# Altium footprint library Indruino.PcbLib: 383 footprints (part 17 of 24)
Each footprint in its own frame and in the unit in brackets; x right, y up, seen from the top. Pads: shape width x height; smd on the part's side, far side on the other; paste and mask are expansions set on the pad; w line width, h text height; cw(c..) or ccw(c..) is an arc to the next point about the centre after c.
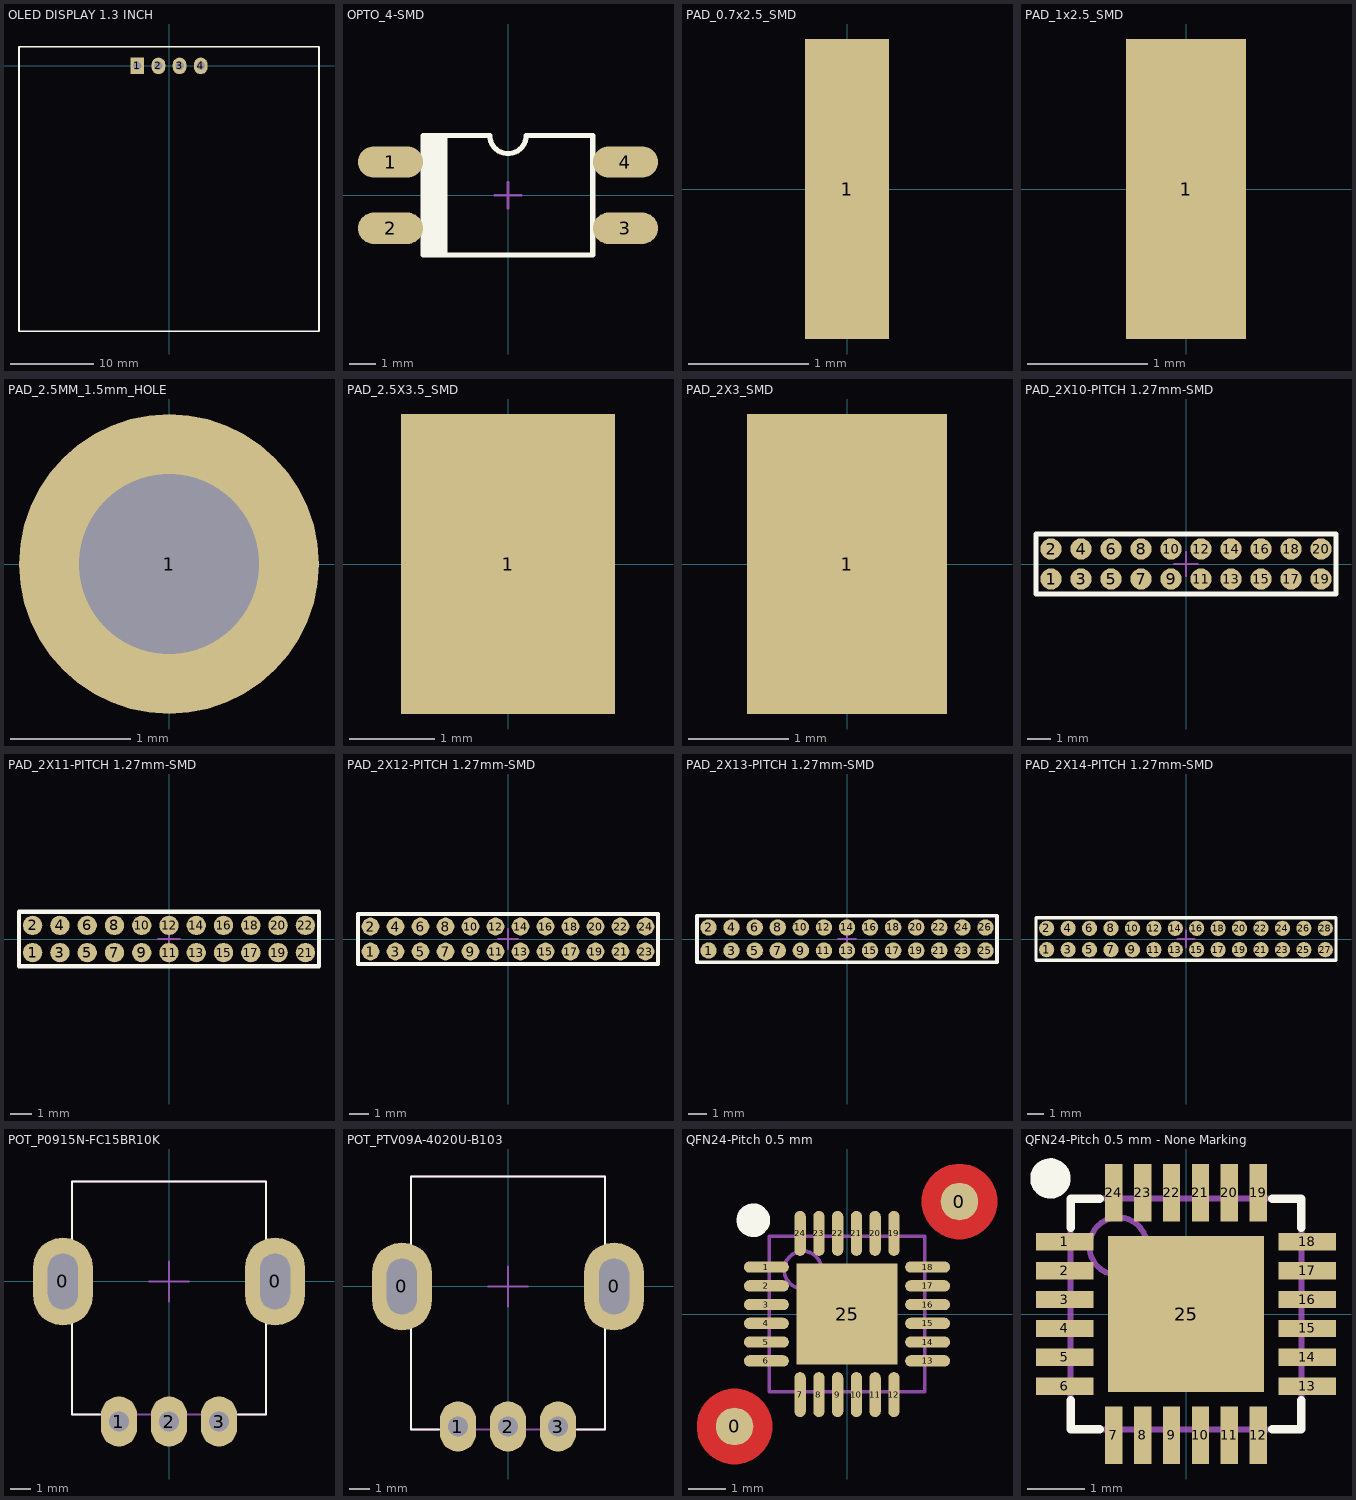
[diagram p16: the footprints below, top view; thin cyan lines are the x and y axes]

## OLED DISPLAY 1.3 INCH [mm]
pads (4):
  rect 1.65x2 hole 1: 1(-3.81,0)
  oval 1.65x2 hole 1: 2(-1.27,0) 3(1.27,0) 4(3.81,0)
Top Overlay:
  lines w0.2: -18,-31.85 18,-31.85 18,2.3 -18,2.3 -18,-31.85
3D body "OLED MONITOR V1.0.STEP": height 9, standoff -2.94, extent -17.7,-31.5 17.7,2

## OPTO_4-SMD [mm]
pads (4):
  oval 2.5x1.2 smd: 1(-4.5,1.27) 2(-4.5,-1.27) 3(4.5,-1.27) 4(4.5,1.27)
Top Overlay:
  rectangle: -3.25,-2.29 -2.32,2.32
  lines w0.2: -3.25,-2.29 -3.25,2.29 -0.7,2.29 ccw(c0,2.29) 0.7,2.29 3.25,2.29 3.25,-2.29 -3.25,-2.29
Mechanical 15:
  lines w0.1: -0.5,0 0.5,0 ; 0,-0.5 0,0.5
3D body "PC817.STEP": height 3.91, standoff 0, extent -5,-2.278 5,2.302

## PAD_0.7x2.5_SMD [mm]
height 2
pads (1):
  rect 0.7x2.5 smd: 1(0,0)
3D body: height 0.05, standoff 0, extent -0.35,-1.25 0.35,1.25

## PAD_1x2.5_SMD [mm]
height 2
pads (1):
  rect 1x2.5 smd: 1(0,0)
3D body: height 0.05, standoff 0, extent -0.5,-1.25 0.5,1.25

## PAD_2.5MM_1.5mm_HOLE [mm]
pads (1):
  round 2.5 hole 1.5: 1(0,0)

## PAD_2.5X3.5_SMD [mm]
height 2
pads (1):
  rect 2.5x3.5 smd: 1(0,0)
3D body: height 0.05, standoff 0, extent -1.25,-1.75 1.25,1.75

## PAD_2X3_SMD [mm]
height 2
pads (1):
  rect 2x3 smd: 1(0,0)
3D body: height 0.05, standoff 0, extent -1,-1.5 1,1.5

## PAD_2X10-PITCH 1.27mm-SMD [mm]
pads (20):
  round 0.9 smd: 1(-5.715,-0.635) 2(-5.715,0.635) 3(-4.445,-0.635) 4(-4.445,0.635) 5(-3.175,-0.635) 6(-3.175,0.635) 7(-1.905,-0.635) 8(-1.905,0.635) 9(-0.635,-0.635) 10(-0.635,0.635) 11(0.635,-0.635) 12(0.635,0.635) 13(1.905,-0.635) 14(1.905,0.635) 15(3.175,-0.635) 16(3.175,0.635) 17(4.445,-0.635) 18(4.445,0.635) 19(5.715,-0.635) 20(5.715,0.635)
Top Overlay:
  lines w0.2: -6.35,-1.27 6.35,-1.27 6.35,1.27 -6.35,1.27 -6.35,-1.27
Mechanical 15:
  lines w0.1: -0.5,0 0.5,0 ; 0,-0.5 0,0.5
3D body: height 0.1, standoff 0, extent 3.995,0.185 4.895,1.085
3D body: height 0.1, standoff 0, extent 3.995,-1.085 4.895,-0.185
3D body: height 0.1, standoff 0, extent 5.265,-1.085 6.165,-0.185
3D body: height 0.1, standoff 0, extent 5.265,0.185 6.165,1.085
3D body: height 0.1, standoff 0, extent 1.455,0.185 2.355,1.085
3D body: height 0.1, standoff 0, extent 1.455,-1.085 2.355,-0.185
3D body: height 0.1, standoff 0, extent 2.725,-1.085 3.625,-0.185
3D body: height 0.1, standoff 0, extent 2.725,0.185 3.625,1.085
3D body: height 0.1, standoff 0, extent -1.085,0.185 -0.185,1.085
3D body: height 0.1, standoff 0, extent -1.085,-1.085 -0.185,-0.185
3D body: height 0.1, standoff 0, extent 0.185,-1.085 1.085,-0.185
3D body: height 0.1, standoff 0, extent 0.185,0.185 1.085,1.085
3D body: height 0.1, standoff 0, extent -3.625,0.185 -2.725,1.085
3D body: height 0.1, standoff 0, extent -3.625,-1.085 -2.725,-0.185
3D body: height 0.1, standoff 0, extent -2.355,-1.085 -1.455,-0.185
3D body: height 0.1, standoff 0, extent -2.355,0.185 -1.455,1.085
3D body: height 0.1, standoff 0, extent -6.165,0.185 -5.265,1.085
3D body: height 0.1, standoff 0, extent -6.165,-1.085 -5.265,-0.185
3D body: height 0.1, standoff 0, extent -4.895,-1.085 -3.995,-0.185
3D body: height 0.1, standoff 0, extent -4.895,0.185 -3.995,1.085

## PAD_2X11-PITCH 1.27mm-SMD [mm]
pads (22):
  round 0.9 smd: 1(-6.35,-0.635) 2(-6.35,0.635) 3(-5.08,-0.635) 4(-5.08,0.635) 5(-3.81,-0.635) 6(-3.81,0.635) 7(-2.54,-0.635) 8(-2.54,0.635) 9(-1.27,-0.635) 10(-1.27,0.635) 11(0,-0.635) 12(0,0.635) 13(1.27,-0.635) 14(1.27,0.635) 15(2.54,-0.635) 16(2.54,0.635) 17(3.81,-0.635) 18(3.81,0.635) 19(5.08,-0.635) 20(5.08,0.635) 21(6.35,-0.635) 22(6.35,0.635)
Top Overlay:
  lines w0.2: -6.985,-1.27 -6.985,1.27 6.985,1.27 6.985,-1.27 -6.985,-1.27
Mechanical 15:
  lines w0.1: -0.5,0 0.5,0 ; 0,-0.5 0,0.5
3D body: height 0.1, standoff 0, extent -5.53,0.185 -4.63,1.085
3D body: height 0.1, standoff 0, extent -5.53,-1.085 -4.63,-0.185
3D body: height 0.1, standoff 0, extent -6.8,-1.085 -5.9,-0.185
3D body: height 0.1, standoff 0, extent -6.8,0.185 -5.9,1.085
3D body: height 0.1, standoff 0, extent -2.99,0.185 -2.09,1.085
3D body: height 0.1, standoff 0, extent -2.99,-1.085 -2.09,-0.185
3D body: height 0.1, standoff 0, extent -4.26,-1.085 -3.36,-0.185
3D body: height 0.1, standoff 0, extent -4.26,0.185 -3.36,1.085
3D body: height 0.1, standoff 0, extent -0.45,0.185 0.45,1.085
3D body: height 0.1, standoff 0, extent -0.45,-1.085 0.45,-0.185
3D body: height 0.1, standoff 0, extent -1.72,-1.085 -0.82,-0.185
3D body: height 0.1, standoff 0, extent -1.72,0.185 -0.82,1.085
3D body: height 0.1, standoff 0, extent 2.09,0.185 2.99,1.085
3D body: height 0.1, standoff 0, extent 2.09,-1.085 2.99,-0.185
3D body: height 0.1, standoff 0, extent 0.82,-1.085 1.72,-0.185
3D body: height 0.1, standoff 0, extent 0.82,0.185 1.72,1.085
3D body: height 0.1, standoff 0, extent 4.63,0.185 5.53,1.085
3D body: height 0.1, standoff 0, extent 4.63,-1.085 5.53,-0.185
3D body: height 0.1, standoff 0, extent 3.36,-1.085 4.26,-0.185
3D body: height 0.1, standoff 0, extent 3.36,0.185 4.26,1.085
3D body: height 0.1, standoff 0, extent 5.9,-1.085 6.8,-0.185
3D body: height 0.1, standoff 0, extent 5.9,0.185 6.8,1.085

## PAD_2X12-PITCH 1.27mm-SMD [mm]
pads (24):
  round 0.9 smd: 1(-6.985,-0.635) 2(-6.985,0.635) 3(-5.715,-0.635) 4(-5.715,0.635) 5(-4.445,-0.635) 6(-4.445,0.635) 7(-3.175,-0.635) 8(-3.175,0.635) 9(-1.905,-0.635) 10(-1.905,0.635) 11(-0.635,-0.635) 12(-0.635,0.635) 13(0.635,-0.635) 14(0.635,0.635) 15(1.905,-0.635) 16(1.905,0.635) 17(3.175,-0.635) 18(3.175,0.635) 19(4.445,-0.635) 20(4.445,0.635) 21(5.715,-0.635) 22(5.715,0.635) 23(6.985,-0.635) 24(6.985,0.635)
Top Overlay:
  lines w0.2: -7.62,-1.27 -7.62,1.27 7.62,1.27 7.62,-1.27 -7.62,-1.27
Mechanical 15:
  lines w0.1: -0.5,0 0.5,0 ; 0,-0.5 0,0.5
3D body: height 0.1, standoff 0, extent -7.435,0.185 -6.535,1.085
3D body: height 0.1, standoff 0, extent -7.435,-1.085 -6.535,-0.185
3D body: height 0.1, standoff 0, extent -6.165,-1.085 -5.265,-0.185
3D body: height 0.1, standoff 0, extent -6.165,0.185 -5.265,1.085
3D body: height 0.1, standoff 0, extent -3.625,0.185 -2.725,1.085
3D body: height 0.1, standoff 0, extent -3.625,-1.085 -2.725,-0.185
3D body: height 0.1, standoff 0, extent -4.895,-1.085 -3.995,-0.185
3D body: height 0.1, standoff 0, extent -4.895,0.185 -3.995,1.085
3D body: height 0.1, standoff 0, extent -1.085,0.185 -0.185,1.085
3D body: height 0.1, standoff 0, extent -1.085,-1.085 -0.185,-0.185
3D body: height 0.1, standoff 0, extent -2.355,-1.085 -1.455,-0.185
3D body: height 0.1, standoff 0, extent -2.355,0.185 -1.455,1.085
3D body: height 0.1, standoff 0, extent 1.455,0.185 2.355,1.085
3D body: height 0.1, standoff 0, extent 1.455,-1.085 2.355,-0.185
3D body: height 0.1, standoff 0, extent 0.185,-1.085 1.085,-0.185
3D body: height 0.1, standoff 0, extent 0.185,0.185 1.085,1.085
3D body: height 0.1, standoff 0, extent 3.995,0.185 4.895,1.085
3D body: height 0.1, standoff 0, extent 3.995,-1.085 4.895,-0.185
3D body: height 0.1, standoff 0, extent 2.725,-1.085 3.625,-0.185
3D body: height 0.1, standoff 0, extent 2.725,0.185 3.625,1.085
3D body: height 0.1, standoff 0, extent 6.535,0.185 7.435,1.085
3D body: height 0.1, standoff 0, extent 6.535,-1.085 7.435,-0.185
3D body: height 0.1, standoff 0, extent 5.265,-1.085 6.165,-0.185
3D body: height 0.1, standoff 0, extent 5.265,0.185 6.165,1.085

## PAD_2X13-PITCH 1.27mm-SMD [mm]
pads (26):
  round 0.9 smd: 1(-7.62,-0.635) 2(-7.62,0.635) 3(-6.35,-0.635) 4(-6.35,0.635) 5(-5.08,-0.635) 6(-5.08,0.635) 7(-3.81,-0.635) 8(-3.81,0.635) 9(-2.54,-0.635) 10(-2.54,0.635) 11(-1.27,-0.635) 12(-1.27,0.635) 13(0,-0.635) 14(0,0.635) 15(1.27,-0.635) 16(1.27,0.635) 17(2.54,-0.635) 18(2.54,0.635) 19(3.81,-0.635) 20(3.81,0.635) 21(5.08,-0.635) 22(5.08,0.635) 23(6.35,-0.635) 24(6.35,0.635) 25(7.62,-0.635) 26(7.62,0.635)
Top Overlay:
  lines w0.2: -8.255,-1.27 8.255,-1.27 8.255,1.27 -8.255,1.27 -8.255,-1.27
Mechanical 15:
  lines w0.1: -0.5,0 0.5,0 ; 0,-0.5 0,0.5
3D body: height 0.1, standoff 0, extent 4.63,0.185 5.53,1.085
3D body: height 0.1, standoff 0, extent 4.63,-1.085 5.53,-0.185
3D body: height 0.1, standoff 0, extent 5.9,-1.085 6.8,-0.185
3D body: height 0.1, standoff 0, extent 5.9,0.185 6.8,1.085
3D body: height 0.1, standoff 0, extent 2.09,0.185 2.99,1.085
3D body: height 0.1, standoff 0, extent 2.09,-1.085 2.99,-0.185
3D body: height 0.1, standoff 0, extent 3.36,-1.085 4.26,-0.185
3D body: height 0.1, standoff 0, extent 3.36,0.185 4.26,1.085
3D body: height 0.1, standoff 0, extent -0.45,0.185 0.45,1.085
3D body: height 0.1, standoff 0, extent -0.45,-1.085 0.45,-0.185
3D body: height 0.1, standoff 0, extent 0.82,-1.085 1.72,-0.185
3D body: height 0.1, standoff 0, extent 0.82,0.185 1.72,1.085
3D body: height 0.1, standoff 0, extent -2.99,0.185 -2.09,1.085
3D body: height 0.1, standoff 0, extent -2.99,-1.085 -2.09,-0.185
3D body: height 0.1, standoff 0, extent -1.72,-1.085 -0.82,-0.185
3D body: height 0.1, standoff 0, extent -1.72,0.185 -0.82,1.085
3D body: height 0.1, standoff 0, extent -5.53,0.185 -4.63,1.085
3D body: height 0.1, standoff 0, extent -5.53,-1.085 -4.63,-0.185
3D body: height 0.1, standoff 0, extent -4.26,-1.085 -3.36,-0.185
3D body: height 0.1, standoff 0, extent -4.26,0.185 -3.36,1.085
3D body: height 0.1, standoff 0, extent -6.8,0.185 -5.9,1.085
3D body: height 0.1, standoff 0, extent -6.8,-1.085 -5.9,-0.185
3D body: height 0.1, standoff 0, extent -8.07,-1.085 -7.17,-0.185
3D body: height 0.1, standoff 0, extent -8.07,0.185 -7.17,1.085
3D body: height 0.1, standoff 0, extent 7.17,0.185 8.07,1.085
3D body: height 0.1, standoff 0, extent 7.17,-1.085 8.07,-0.185

## PAD_2X14-PITCH 1.27mm-SMD [mm]
pads (28):
  round 0.9 smd: 1(-8.255,-0.635) 2(-8.255,0.635) 3(-6.985,-0.635) 4(-6.985,0.635) 5(-5.715,-0.635) 6(-5.715,0.635) 7(-4.445,-0.635) 8(-4.445,0.635) 9(-3.175,-0.635) 10(-3.175,0.635) 11(-1.905,-0.635) 12(-1.905,0.635) 13(-0.635,-0.635) 14(-0.635,0.635) 15(0.635,-0.635) 16(0.635,0.635) 17(1.905,-0.635) 18(1.905,0.635) 19(3.175,-0.635) 20(3.175,0.635) 21(4.445,-0.635) 22(4.445,0.635) 23(5.715,-0.635) 24(5.715,0.635) 25(6.985,-0.635) 26(6.985,0.635) 27(8.255,-0.635) 28(8.255,0.635)
Top Overlay:
  lines w0.2: -8.89,-1.27 8.89,-1.27 8.89,1.27 -8.89,1.27 -8.89,-1.27
Mechanical 15:
  lines w0.1: -0.5,0 0.5,0 ; 0,-0.5 0,0.5
3D body: height 0.1, standoff 0, extent 3.995,0.185 4.895,1.085
3D body: height 0.1, standoff 0, extent 3.995,-1.085 4.895,-0.185
3D body: height 0.1, standoff 0, extent 5.265,-1.085 6.165,-0.185
3D body: height 0.1, standoff 0, extent 5.265,0.185 6.165,1.085
3D body: height 0.1, standoff 0, extent 1.455,0.185 2.355,1.085
3D body: height 0.1, standoff 0, extent 1.455,-1.085 2.355,-0.185
3D body: height 0.1, standoff 0, extent 2.725,-1.085 3.625,-0.185
3D body: height 0.1, standoff 0, extent 2.725,0.185 3.625,1.085
3D body: height 0.1, standoff 0, extent -1.085,0.185 -0.185,1.085
3D body: height 0.1, standoff 0, extent -1.085,-1.085 -0.185,-0.185
3D body: height 0.1, standoff 0, extent 0.185,-1.085 1.085,-0.185
3D body: height 0.1, standoff 0, extent 0.185,0.185 1.085,1.085
3D body: height 0.1, standoff 0, extent -3.625,0.185 -2.725,1.085
3D body: height 0.1, standoff 0, extent -3.625,-1.085 -2.725,-0.185
3D body: height 0.1, standoff 0, extent -2.355,-1.085 -1.455,-0.185
3D body: height 0.1, standoff 0, extent -2.355,0.185 -1.455,1.085
3D body: height 0.1, standoff 0, extent -6.165,0.185 -5.265,1.085
3D body: height 0.1, standoff 0, extent -6.165,-1.085 -5.265,-0.185
3D body: height 0.1, standoff 0, extent -4.895,-1.085 -3.995,-0.185
3D body: height 0.1, standoff 0, extent -4.895,0.185 -3.995,1.085
3D body: height 0.1, standoff 0, extent -7.435,0.185 -6.535,1.085
3D body: height 0.1, standoff 0, extent -7.435,-1.085 -6.535,-0.185
3D body: height 0.1, standoff 0, extent -8.705,-1.085 -7.805,-0.185
3D body: height 0.1, standoff 0, extent -8.705,0.185 -7.805,1.085
3D body: height 0.1, standoff 0, extent 6.535,0.185 7.435,1.085
3D body: height 0.1, standoff 0, extent 6.535,-1.085 7.435,-0.185
3D body: height 0.1, standoff 0, extent 7.805,-1.085 8.705,-0.185
3D body: height 0.1, standoff 0, extent 7.805,0.185 8.705,1.085

## POT_P0915N-FC15BR10K [mm]
pads (5):
  oval 3x4.4 hole 2.8 slot 1.5 at 0 deg: 0(-5.3,0) 0(5.3,0)
  oval 1.8x2.5 hole 1: 1(-2.5,-7) 2(0,-7) 3(2.5,-7)
Top Overlay:
  lines w0.1: -3.45,-6.65 -4.85,-6.65 -4.85,5 4.85,5 4.85,-6.65 3.45,-6.65
Mechanical 13:
  lines w0.1: -4.85,-6.65 4.85,-6.65 4.85,5 -4.85,5 -4.85,-6.65
Mechanical 15:
  lines w0.1: -1,0 1,0 ; 0,-1 0,1
3D body "P0915N-FC15BR10K_2.STEP": height 26.87, standoff -2.12, extent -6.05,-7.45 6.05,4.9

## POT_PTV09A-4020U-B103 [mm]
pads (5):
  oval 3x4.4 hole 2.8 slot 1.5 at 0 deg: 0(-5.3,0) 0(5.3,0)
  oval 1.8x2.5 hole 1: 1(-2.5,-7) 2(0,-7) 3(2.5,-7)
Top Overlay:
  lines w0.1: -3.45,-7.15 -4.85,-7.15 -4.85,5.5 4.85,5.5 4.85,-7.15 3.45,-7.15
Mechanical 13:
  lines w0.1: -4.85,-7.15 4.85,-7.15 4.85,5.5 -4.85,5.5 -4.85,-7.15
Mechanical 15:
  lines w0.1: -1,0 1,0 ; 0,-1 0,1
3D body "ptv09a-4x15f-xxxx.stp": height 15.05, standoff -3.94, extent -5.7,-7.15 5.7,5.5

## QFN24-Pitch 0.5 mm [mm] "QFN, 24-Leads, Body 4x4mm, Pitch 0.5mm, IPC High Density"
height 0.8
pads (27):
  round 1 smd mask+0.5: 0(-3,-3) 0(3,3)
  oval 1.2x0.3 smd: 1(-2.15,1.25) 2(-2.15,0.75) 3(-2.15,0.25) 4(-2.15,-0.25) 5(-2.15,-0.75) 6(-2.15,-1.25) 13(2.15,-1.25) 14(2.15,-0.75) 15(2.15,-0.25) 16(2.15,0.25) 17(2.15,0.75) 18(2.15,1.25)
  oval 0.3x1.2 smd: 7(-1.25,-2.15) 8(-0.75,-2.15) 9(-0.25,-2.15) 10(0.25,-2.15) 11(0.75,-2.15) 12(1.25,-2.15) 19(1.25,2.15) 20(0.75,2.15) 21(0.25,2.15) 22(-0.25,2.15) 23(-0.75,2.15) 24(-1.25,2.15)
  rect 2.7x2.7 smd: 25(0,0)
Top Layer:
  pour cut-out: 3,2 2.902,2 2.708,2.038 2.526,2.114 2.363,2.223 2.223,2.363 2.114,2.526 2.038,2.708 2,2.902 2,3 2,3.098 2.038,3.292 2.114,3.474 2.223,3.637 2.363,3.777 2.526,3.886 2.708,3.962 2.902,4 3,4 3.098,4 3.292,3.962 3.474,3.886 3.637,3.777 3.777,3.637 3.886,3.474 3.962,3.292 4,3.098 4,3 4,2.902 3.962,2.708 3.886,2.526 3.777,2.363 3.637,2.223 3.474,2.114 3.292,2.038 3.098,2
  pour cut-out: -3,-4 -3.098,-4 -3.292,-3.962 -3.474,-3.886 -3.637,-3.777 -3.777,-3.637 -3.886,-3.474 -3.962,-3.292 -4,-3.098 -4,-3 -4,-2.902 -3.962,-2.708 -3.886,-2.526 -3.777,-2.363 -3.637,-2.223 -3.474,-2.114 -3.292,-2.038 -3.098,-2 -3,-2 -2.902,-2 -2.708,-2.038 -2.526,-2.114 -2.363,-2.223 -2.223,-2.363 -2.114,-2.526 -2.038,-2.708 -2,-2.902 -2,-3 -2,-3.098 -2.038,-3.292 -2.114,-3.474 -2.223,-3.637 -2.363,-3.777 -2.526,-3.886 -2.708,-3.962 -2.902,-4
Top Overlay:
  circle w0.2: c-2.5,2.5 r0.35
  region: -2.5,2.15 -2.57,2.15 -2.698,2.203 -2.797,2.302 -2.85,2.43 -2.85,2.5 -2.85,2.57 -2.797,2.698 -2.698,2.797 -2.57,2.85 -2.5,2.85 -2.43,2.85 -2.302,2.797 -2.203,2.698 -2.15,2.57 -2.15,2.5 -2.15,2.43 -2.203,2.302 -2.302,2.203 -2.43,2.15
Mechanical 13:
  circle w0.1: c-1.175,1.175 r0.5
  lines w0.1: -2.075,-2.075 2.075,-2.075 2.075,2.075 -2.075,2.075 -2.075,-2.075
Mechanical 15:
  circle w0.254: c0,0 r0.1
  lines w0.1: -0.216,0.865 0,1 ; 0.196,0.87 0,1 ; 0.999,-0.176 1.288,0.005 ; 1.004,0.191 1.271,0.014 ; 1.286,0 0,0 0,1
  text "Y" at -0.954,0.33 h0.7
  text "X" at 0.768,-1.085 h0.7
  text "Z" at -0.752,-1.059 h0.7
3D body "QFN24(4X4).STEP": height 0.88, standoff -0.02, extent -2.01,-2.01 2.01,2.01

## QFN24-Pitch 0.5 mm - None Marking [mm] "QFN, 24-Leads, Body 4x4mm, Pitch 0.5mm, IPC High Density"
height 0.8
pads (25):
  rect 1x0.3 smd: 1(-2.1,1.25) 2(-2.1,0.75) 3(-2.1,0.25) 4(-2.1,-0.25) 5(-2.1,-0.75) 6(-2.1,-1.25) 13(2.1,-1.25) 14(2.1,-0.75) 15(2.1,-0.25) 16(2.1,0.25) 17(2.1,0.75) 18(2.1,1.25)
  rect 0.3x1 smd: 7(-1.25,-2.1) 8(-0.75,-2.1) 9(-0.25,-2.1) 10(0.25,-2.1) 11(0.75,-2.1) 12(1.25,-2.1) 19(1.25,2.1) 20(0.75,2.1) 21(0.25,2.1) 22(-0.25,2.1) 23(-0.75,2.1) 24(-1.25,2.1)
  rect 2.7x2.7 smd: 25(0,0)
Top Overlay:
  circle w0.2: c-2.35,2.35 r0.25
  region: -2.35,2.1 -2.4,2.1 -2.492,2.138 -2.562,2.208 -2.6,2.3 -2.6,2.35 -2.6,2.4 -2.562,2.492 -2.492,2.562 -2.4,2.6 -2.35,2.6 -2.3,2.6 -2.208,2.562 -2.138,2.492 -2.1,2.4 -2.1,2.35 -2.1,2.3 -2.138,2.208 -2.208,2.138 -2.3,2.1
  lines w0.15: -2,-1.5 -2,-2 -1.5,-2 ; -2,1.5 -2,2 -1.5,2 ; 1.5,-2 2,-2 2,-1.5 ; 1.5,2 2,2 2,1.5
Mechanical 13:
  circle w0.1: c-1.175,1.175 r0.5
  lines w0.1: -2,-2 -2,2 2,2 2,-2 -2,-2
Mechanical 15:
  circle w0.254: c0,0 r0.1
  lines w0.1: -0.216,0.865 0,1 ; 0.196,0.87 0,1 ; 0.999,-0.176 1.288,0.005 ; 1.004,0.191 1.271,0.014 ; 1.286,0 0,0 0,1
  text "Z" at -0.752,-1.059 h0.7
  text "X" at 0.768,-1.085 h0.7
  text "Y" at -0.954,0.33 h0.7
3D body "QFN24(4X4).STEP": height 0.88, standoff -0.02, extent -2.01,-2.01 2.01,2.01